# Altium footprint library TomvanRijn-PCB.PcbLib: 165 footprints (part 8 of 11)
Each footprint in its own frame and in the unit in brackets; x right, y up, seen from the top. Pads: shape width x height; smd on the part's side, far side on the other; paste and mask are expansions set on the pad; w line width, h text height; cw(c..) or ccw(c..) is an arc to the next point about the centre after c.
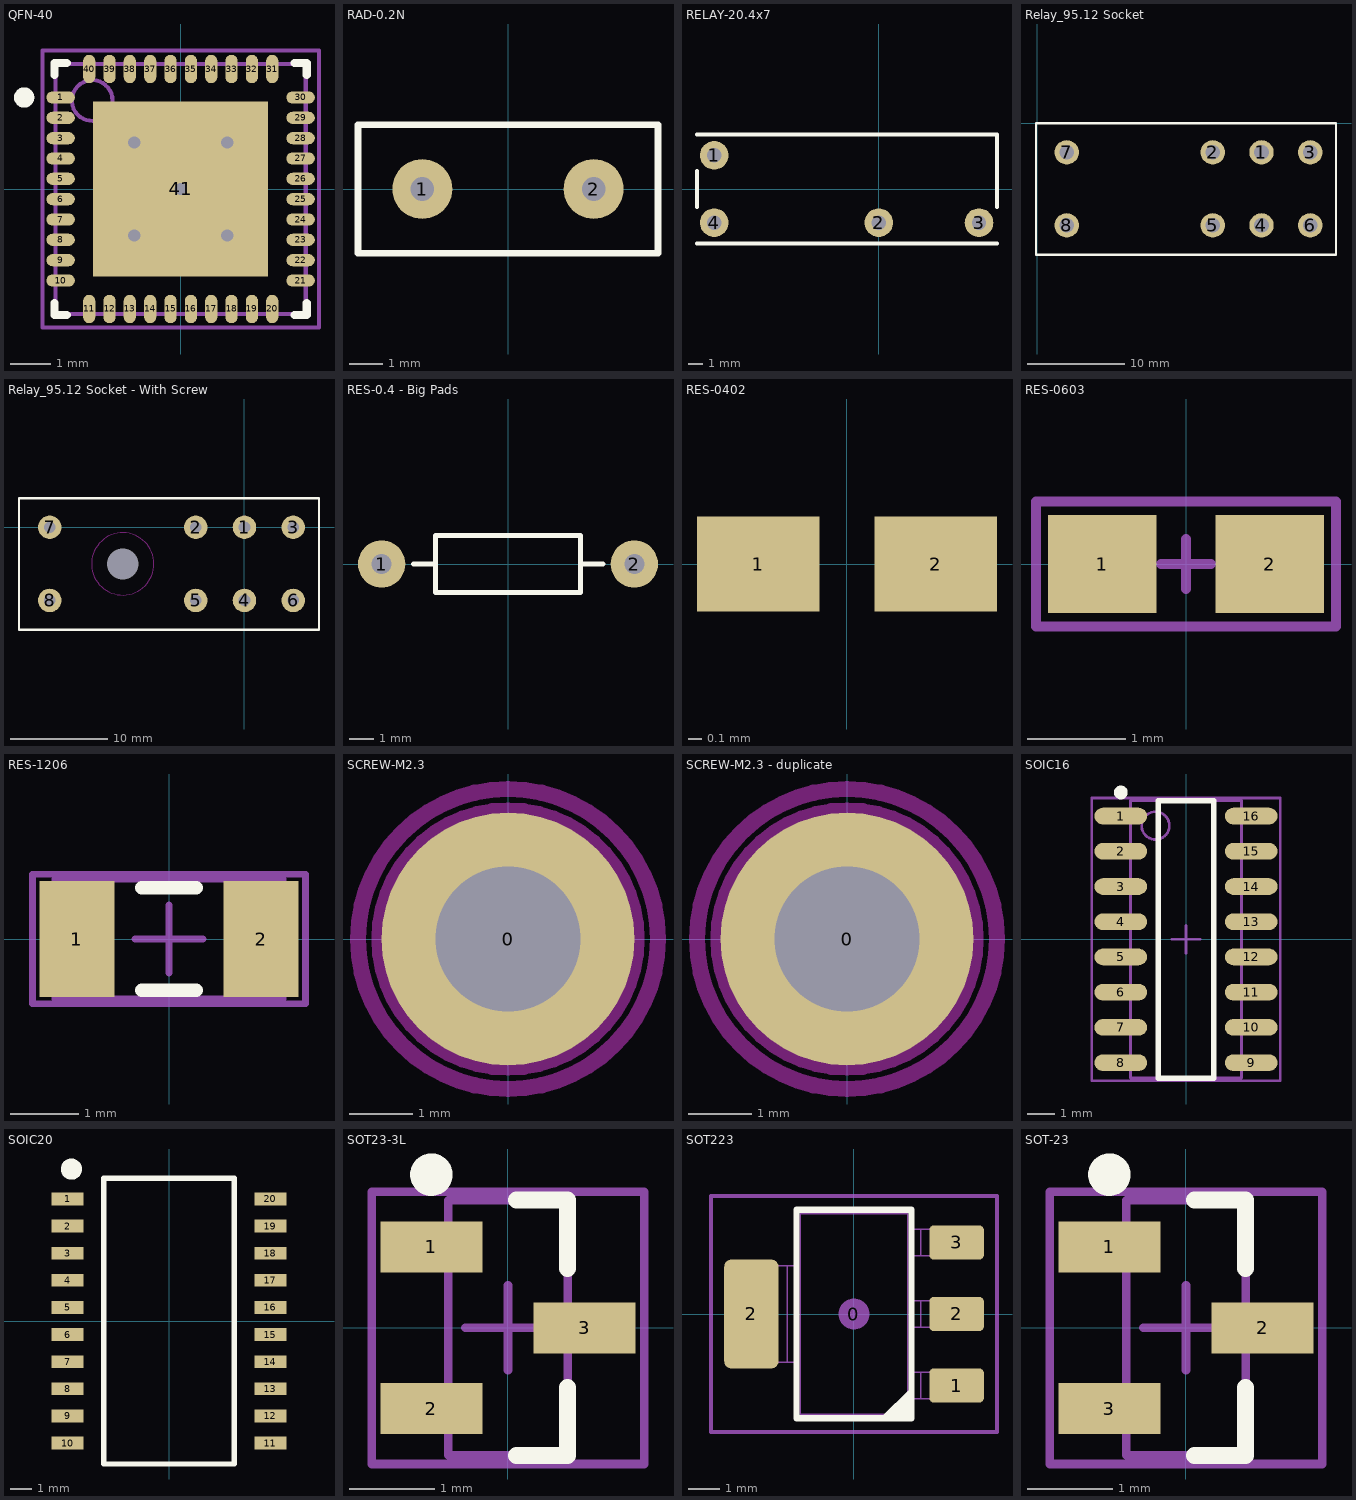
[diagram p7: the footprints below, top view; thin cyan lines are the x and y axes]

## QFN-40 [mm] "QFN, 40-Leads, Body 6x6mm, Pitch 0.5mm,"
height 1
pads (41):
  oval 0.7x0.3 smd: 1(-2.95,2.25) 2(-2.95,1.75) 3(-2.95,1.25) 4(-2.95,0.75) 5(-2.95,0.25) 6(-2.95,-0.25) 7(-2.95,-0.75) 8(-2.95,-1.25) 9(-2.95,-1.75) 10(-2.95,-2.25) 21(2.95,-2.25) 22(2.95,-1.75) 23(2.95,-1.25) 24(2.95,-0.75) 25(2.95,-0.25) 26(2.95,0.25) 27(2.95,0.75) 28(2.95,1.25) 29(2.95,1.75) 30(2.95,2.25)
  oval 0.3x0.7 smd: 11(-2.25,-2.95) 12(-1.75,-2.95) 13(-1.25,-2.95) 14(-0.75,-2.95) 15(-0.25,-2.95) 16(0.25,-2.95) 17(0.75,-2.95) 18(1.25,-2.95) 19(1.75,-2.95) 20(2.25,-2.95) 31(2.25,2.95) 32(1.75,2.95) 33(1.25,2.95) 34(0.75,2.95) 35(0.25,2.95) 36(-0.25,2.95) 37(-0.75,2.95) 38(-1.25,2.95) 39(-1.75,2.95) 40(-2.25,2.95)
  rect 4.3x4.3 smd: 41(0,0)
via 0,0 diameter 0.7 hole 0.3
via 1.143,1.143 diameter 0.7 hole 0.3
via -1.143,1.143 diameter 0.7 hole 0.3
via 1.143,-1.143 diameter 0.7 hole 0.3
via -1.143,-1.143 diameter 0.7 hole 0.3
Top Overlay:
  circle w0.25: c-3.85,2.25 r0.125
  lines w0.2: -3.1,-2.8 -3.1,-3.1 -2.8,-3.1 ; -3.1,2.8 -3.1,3.1 -2.8,3.1 ; 2.8,-3.1 3.1,-3.1 3.1,-2.8 ; 2.8,3.1 3.1,3.1 3.1,2.8
Mechanical 13:
  circle w0.1: c-2.175,2.175 r0.5
  lines w0.1: -3.075,-3.075 -3.075,3.075 3.075,3.075 3.075,-3.075 -3.075,-3.075
Mechanical 15:
  lines w0.1: -0.5,0 0.5,0 ; 0,-0.5 0,0.5 ; -3.4,-3.4 -3.4,3.4 3.4,3.4 3.4,-3.4 -3.4,-3.4
3D body "QFN-40.step": height 1.04, standoff -0.01, extent -3.075,-3.073 3.075,3.077

## RAD-0.2N [mil] "Radial Cap, Thru-Hole; 2 Leads; 0.2 in Pin Spacing"
height 250
pads (2):
  round 70 hole 27.56: 1(-100,0) 2(100,0)
Top Overlay:
  lines w7.87: -175,-75 -175,75 175,75 175,-75 -175,-75
3D body "User Library-Ceramic Disc Capacitor 0_2in pitch.step": height 295.28, standoff -39.37, extent -137.43,-33.39 137.8,33.4

## RELAY-20.4x7 [mm] "Relay, leads 4.7 : 11.5 : 7 mm, body 20.40 x 7 x 15 mm"
height 15
pads (4):
  round 2 hole 1: 1(-11.5,2.35) 2(0,-2.35) 3(7,-2.35) 4(-11.5,-2.35)
Top Overlay:
  lines w0.254: -12.7,-3.81 8.255,-3.81 ; -12.7,-1.27 -12.7,1.285 ; -12.7,3.81 8.255,3.81 8.255,-1.27
3D body: height 3, standoff -2, extent -11.847,-2.699 -11.15,-2.001
3D body: height 3, standoff -2, extent 6.653,-2.699 7.35,-2.001
3D body: height 3, standoff -2, extent -11.847,2.001 -11.15,2.699
3D body: height 3, standoff -2, extent -0.347,-2.699 0.35,-2.001
3D body: height 15, standoff 0, extent -12.602,-3.452 8.102,3.452

## Relay_95.12 Socket [mm] "12VDC, 8A, DPDT Finder 40.52 Relay"
height 25
pads (8):
  round 2.5 hole 1.5: 1(23,-3) 2(18,-3) 3(28,-3) 4(23,-10.5) 5(18,-10.5) 6(28,-10.5) 7(3,-3) 8(3,-10.5)
Top Overlay:
  lines w0.254: -0.15,-13.5 -0.15,-0.025 30.65,-0.025 30.65,-13.5 -0.15,-13.5
3D body "Relay-Base-95 Socket.STEP": height 9.2, standoff -4, extent 0,-13.35 30.5,-0.15

## Relay_95.12 Socket - With Screw [mm] "12VDC, 8A, DPDT Finder 40.52 Relay"
height 25
pads (9):
  round 0 hole 3.2 unplated: 0(-12.5,-3.75)
  round 2.413 hole 1.2: 1(0,0) 2(-5,0) 3(5,0) 4(0,-7.5) 5(-5,-7.5) 6(5,-7.5) 7(-20,0) 8(-20,-7.5)
Top Overlay:
  lines w0.254: -23.15,-10.5 -23.15,2.975 7.65,2.975 7.65,-10.5 -23.15,-10.5
Keep-Out Layer:
  circle w0.127: c-12.5,-3.75 r3.2
3D body "User Library-M3X0_5 THREADFORMING SCREW, TORX HEAD.step": height 7.48, standoff -2.92, extent -15.3,-6.55 -9.7,-0.95
3D body "Relay-Base-95 Socket.STEP": height 9.2, standoff -4, extent -23,-10.35 7.5,2.85

## RES-0.4 - Big Pads [mm] "Axial Resistor Thru-Hole; 2 Leads; 0.4 in Pin Spacing"
height 1.524
pads (2):
  round 1.905 hole 0.8: 1(-5.08,0) 2(5.08,0)
Top Overlay:
  lines w0.2: -3.81,0 -2.921,0 ; 2.921,-1.143 -2.921,-1.143 -2.921,1.143 2.921,1.143
  lines w0.203: 2.921,-1.143 2.921,1.143 ; 2.921,0 3.81,0
3D body "RES-0.4.step": height 2.93, standoff -2.54, extent -5.385,-1.156 5.385,1.156

## RES-0402 [mm] "Resistor, SMD, 0402"
height 0.508
pads (2):
  rect 0.9x0.7 smd: 1(-0.65,0) 2(0.65,0)
3D body "0402-res.step": height 0.4, standoff 0, extent -0.5,-0.25 0.5,0.25

## RES-0603 [mm] "SMD resistor, 0603"
height 1.397
pads (2):
  rect 1.1x1 smd: 1(-0.85,0) 2(0.85,0)
Mechanical 15:
  lines w0.1: -0.254,0 0.254,0 ; 0,-0.254 0,0.254 ; -1.524,-0.635 -1.524,0.635 1.524,0.635 1.524,-0.635 -1.524,-0.635
3D body "0603-res.step": height 0.55, standoff 0, extent -0.8,-0.4 0.8,0.4

## RES-1206 [mm] "SMD resistor, 1206"
height 0.635
pads (2):
  rect 1.1x1.7 smd: 1(-1.35,0) 2(1.35,0)
Top Overlay:
  lines w0.2: -0.4,-0.75 0.4,-0.75 ; -0.4,0.75 0.4,0.75
Mechanical 13:
  lines w0.1: -1.675,-0.875 -1.675,0.875 1.675,0.875 1.675,-0.875 -1.675,-0.875
Mechanical 15:
  lines w0.1: -0.5,0 0.5,0 ; 0,-0.5 0,0.5 ; -2,-0.95 -2,0.95 2,0.95 2,-0.95 -2,-0.95
3D body "1206-res.step": height 1, standoff 0, extent -1.6,-0.8 1.6,0.8

## SCREW-M2.3 [mm] "Screw M2.3"
height 3
pads (1):
  round 4 hole 2.3 unplated: 0(0,0)
Keep-Out Layer:
  circle w0.254: c0,0 r2.036
  circle w0.254: c0,0 r2.373
3D body "User Library-M2-A4-socket-cap-screw-din 912.step": height 2, standoff -4, extent -1.9,-1.9 1.9,1.9

## SCREW-M2.3 - duplicate [mm] "Screw M2.3"
height 3
pads (1):
  round 4 hole 2.3 unplated: 0(0,0)
Keep-Out Layer:
  circle w0.254: c0,0 r2.373
  circle w0.254: c0,0 r2.036
3D body "User Library-M2-A4-socket-cap-screw-din 912.step": height 3.6, standoff -2.4, extent -1.9,-1.9 1.9,1.9

## SOIC16 [mm] "SOIC Narrow, 16-Leads, Body 9.9x3.9mm, Pitch 1.27mm"
height 1.91
pads (16):
  oval 1.9x0.6 smd: 1(-2.35,4.445) 2(-2.35,3.175) 3(-2.35,1.905) 4(-2.35,0.635) 5(-2.35,-0.635) 6(-2.35,-1.905) 7(-2.35,-3.175) 8(-2.35,-4.445) 9(2.35,-4.445) 10(2.35,-3.175) 11(2.35,-1.905) 12(2.35,-0.635) 13(2.35,0.635) 14(2.35,1.905) 15(2.35,3.175) 16(2.35,4.445)
Top Overlay:
  circle w0.25: c-2.35,5.295 r0.125
  lines w0.2: -1,-5 -1,5 1,5 1,-5 -1,-5
Mechanical 13:
  circle w0.1: c-1.1,4.1 r0.5
  lines w0.1: -2,-5 -2,5 2,5 2,-5 -2,-5
Mechanical 15:
  lines w0.1: -0.5,0 0.5,0 ; 0,-0.5 0,0.5 ; -3.4,-5.1 -3.4,5.1 3.4,5.1 3.4,-5.1 -3.4,-5.1
3D body "SOIC16.step": height 1.65, standoff 0, extent -3.04,-5 3.04,5

## SOIC20 [mm] "SOIC 20 pin, Wb=7,6mm, Wl=10,3mm, L=12,8mm, H=2,3mm, P=1,27"
pads (20):
  rect 1.5x0.6 smd: 1(-4.75,5.715) 2(-4.75,4.445) 3(-4.75,3.175) 4(-4.75,1.905) 5(-4.75,0.635) 6(-4.75,-0.635) 7(-4.75,-1.905) 8(-4.75,-3.175) 9(-4.75,-4.445) 10(-4.75,-5.715) 11(4.75,-5.715) 12(4.75,-4.445) 13(4.75,-3.175) 14(4.75,-1.905) 15(4.75,-0.635) 16(4.75,0.635) 17(4.75,1.905) 18(4.75,3.175) 19(4.75,4.445) 20(4.75,5.715)
Top Overlay:
  circle w0.508: c-4.572,7.112 r0.241
  lines w0.254: -3.048,-6.696 3.048,-6.696 3.048,6.679 -3.048,6.679 -3.048,-6.696
3D body "User Library-SO-20W.STEP": height 2.48, standoff 0, extent -5.155,-6.41 5.155,6.41

## SOT23-3L [mm] "SOT23, 3-Leads, Body 2.9x1.3mm, Pitch 0.95mm, Lead Span 2.5mm, IPC High Density"
height 1.1
pads (3):
  rect 1.2x0.6 smd: 1(-0.9,0.95) 2(-0.9,-0.95) 3(0.9,0)
Top Overlay:
  circle w0.25: c-0.9,1.8 r0.125
  lines w0.2: 0.1,-1.5 0.7,-1.5 0.7,-0.7 ; 0.1,1.5 0.7,1.5 0.7,0.7
Mechanical 13:
  lines w0.1: -0.7,-1.5 0.7,-1.5 0.7,1.5 -0.7,1.5 -0.7,-1.5
Mechanical 15:
  lines w0.1: -0.5,0 0.5,0 ; 0,-0.5 0,0.5 ; -1.6,-1.6 1.6,-1.6 1.6,1.6 -1.6,1.6 -1.6,-1.6
3D body "SOT-23.step": height 1.05, standoff -0.05, extent -1.25,-1.5 1.25,1.5

## SOT223 [mm] "SOT223 /SC-73"
height 1.524
pads (5):
  round 1 on Mech15: 0(0,0)
  rrect25% 1.75x1.1 smd: 1(3.3,-2.3) 2(3.3,0) 3(3.3,2.3)
  rrect25% 1.75x3.5 smd: 2(-3.3,0)
Top Overlay:
  region: 1.85,-3.35 0.85,-3.35 1.85,-2.35
  lines w0.2: -1.85,-3.35 -1.85,3.35 1.85,3.35 1.85,-3.35 -1.85,-3.35
Mechanical 13:
  lines w0.05: -3.186,-1.55 -3.186,1.55 ; -3.062,-1.55 -3.062,1.55 ; -2.506,-1.55 -2.506,1.55 ; -2.152,-1.55 -2.152,1.55 ; -1.85,-1.55 -1.85,-3.35 ; -1.85,1.55 -1.85,3.35 ; 1.85,-2.72 1.85,-3.35 ; 1.85,-1.88 1.85,-0.42 ; 1.85,0.42 1.85,1.88 ; 1.85,2.72 1.85,3.35 ; 2.152,-2.72 2.152,-1.88 ; 2.152,-0.42 2.152,0.42 ; 2.152,1.88 2.152,2.72 ; 2.506,-2.72 2.506,-1.88 ; 2.506,-0.42 2.506,0.42 ; 2.506,1.88 2.506,2.72 ; 3.062,-2.72 3.062,-1.88 ; 3.062,-0.42 3.062,0.42 ; 3.062,1.88 3.062,2.72 ; 3.186,-2.72 3.186,-1.88 ; 3.186,-0.42 3.186,0.42 ; 3.186,1.88 3.186,2.72 ; -1.85,-3.35 1.85,-3.35 ; -1.85,-3.35 -1.731,-3.231 ; -1.85,3.35 1.85,3.35 ; -1.85,3.35 -1.731,3.231 ; -1.731,-3.231 -1.731,3.231 ; -1.731,-3.231 1.731,-3.231 ; -1.731,3.231 1.731,3.231 ; 1.731,-3.231 1.85,-3.35 ; 1.731,-3.231 1.731,3.231 ; 1.731,3.231 1.85,3.35 ; -3.65,-1.55 -3.65,1.55 -1.829,1.55 -1.829,-1.55 -3.65,-1.55 ; 1.829,-2.72 3.65,-2.72 3.65,-1.88 1.829,-1.88 1.829,-2.72 ; 1.829,-0.42 3.65,-0.42 3.65,0.42 1.829,0.42 1.829,-0.42 ; 1.829,1.88 3.65,1.88 3.65,2.72 1.829,2.72 1.829,1.88
Mechanical 15:
  lines w0.127: -4.6,-3.8 4.6,-3.8 4.6,3.8 -4.6,3.8 -4.6,-3.8
3D body "SOT223-4.STEP": height 1.8, standoff 0, extent -3.65,-3.35 3.65,3.35

## SOT-23 [mm] "SOT23, 3-Leads, Body 2.9x1.3mm, Pitch 0.95mm, Lead Span 2.5mm, IPC High Density"
height 1.1
pads (3):
  rect 1.2x0.6 smd: 1(-0.9,0.95) 2(0.9,0) 3(-0.9,-0.95)
Top Overlay:
  circle w0.25: c-0.9,1.8 r0.125
  lines w0.2: 0.1,-1.5 0.7,-1.5 0.7,-0.7 ; 0.1,1.5 0.7,1.5 0.7,0.7
Mechanical 13:
  lines w0.1: -0.7,-1.5 -0.7,1.5 0.7,1.5 0.7,-1.5 -0.7,-1.5
Mechanical 15:
  lines w0.1: -0.5,0 0.5,0 ; 0,-0.5 0,0.5 ; -1.6,-1.6 -1.6,1.6 1.6,1.6 1.6,-1.6 -1.6,-1.6
3D body "SOT-23.step": height 1.05, standoff -0.05, extent -1.25,-1.5 1.25,1.5